# Altium footprint library IC.Pcblib: 91 footprints (part 6 of 6)
Each footprint in its own frame and in the unit in brackets; x right, y up, seen from the top. Pads: shape width x height; smd on the part's side, far side on the other; paste and mask are expansions set on the pad; w line width, h text height; cw(c..) or ccw(c..) is an arc to the next point about the centre after c.
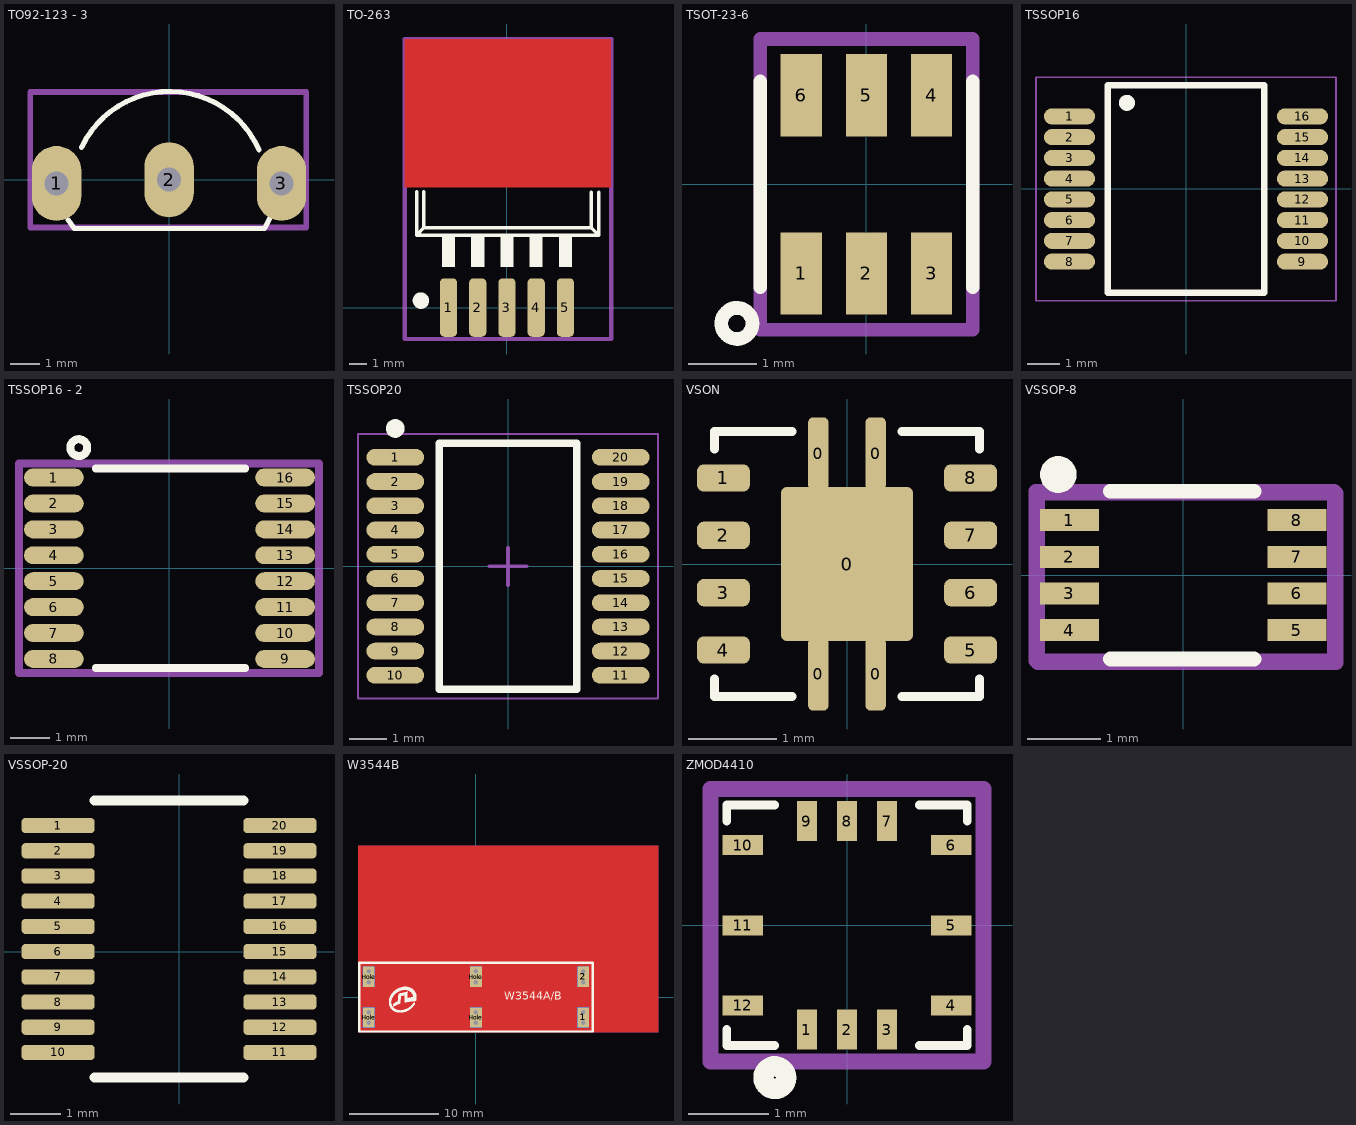
[diagram p5: the footprints below, top view; thin cyan lines are the x and y axes]

## TO92-123 - 3 [mil] "TO-92"
height 200
pads (3):
  oval 66x100 hole 32: 1(-150,-5) 2(0,0) 3(150,-5)
Top Overlay:
  lines w7: -134.46,-53.63 -126.5,-65 127.5,-65 136,-48 ; -116.52,43.21 cw(c0.97,-12.43) 119.94,39.97
Mechanical 13:
  lines w7.87: -185,-64 -185,117 183,117 183,-64 -185,-64
  text ".Designator" at -87,5.43 h39.37
Mechanical 15:
  lines w7.87: -185,-64 -185,117 183,117 183,-64 -185,-64
  text ".Comment" at -86,5.44 h39.37
3D body "User Library-TO-92_SS254.step": height 394.65, standoff -97.48, extent -159.06,-58.47 159.05,93.89

## TO-263 [mm]
pads (5):
  rrect50% 1x3.4 smd: 1(-3.4,0) 2(-1.7,0) 4(1.7,0) 5(3.4,0)
  rrect50% 1x3.4 smd mask+0: 3(0,0)
Top Layer:
  rectangle: -5.949,6.985 6.051,15.619
Top Overlay:
  circle w0.5: c-5.004,0.406 r0.23
  rectangle: 3.021,2.362 3.779,4.241
  rectangle: 1.321,2.362 2.079,4.241
  rectangle: -0.379,2.362 0.379,4.241
  rectangle: -2.079,2.362 -1.321,4.241
  rectangle: -3.779,2.362 -3.021,4.241
  lines w0.2: -5.254,6.731 -5.254,4.216 ; -4.831,6.731 -4.831,4.64 ; 4.906,6.706 4.906,4.64 ; 5.329,6.706 5.329,4.216 ; -5.254,4.216 -4.831,4.64 ; -5.254,4.216 5.329,4.216 ; -4.831,4.64 4.906,4.64 ; 4.906,4.64 5.329,4.216
Top Solder:
  rectangle: -5.517,7.366 5.609,14.529
  lines w0.254: -3.863,14.904 -5.344,14.481 ; 3.938,14.904 5.419,14.481 ; 5.588,14.351 5.715,14.224 5.715,7.239 5.08,7.239 -5.578,7.239 -5.583,7.244 -5.583,12.895 -5.583,14.165 ; 5.658,12.895 5.658,14.165 ; -5.583,14.165 cw(c-5.254,14.165) -5.345,14.481 ; -5.583,14.165 cw(c-5.254,14.165) -5.345,14.481 ; -3.773,14.917 ccw(c-3.773,14.588) -3.863,14.904 cw(c-3.773,14.588) -3.773,14.917 ; -3.773,14.917 3.847,14.917 ; 3.847,14.917 cw(c3.847,14.588) 3.938,14.904 ccw(c3.847,14.588) 3.847,14.917 ; 5.42,14.481 cw(c5.329,14.165) 5.658,14.165 ; 5.42,14.481 cw(c5.329,14.165) 5.658,14.165
  lines w0.508: -4.577,14.546 4.669,14.546
Mechanical 13:
  lines w0.254: -5.944,-1.829 6.071,-1.829 6.071,15.596 -5.944,15.596 -5.944,-1.829
  text ".Designator" at 0.584,-1.549 h3
Mechanical 15:
  lines w0.254: -5.944,-1.829 -5.944,15.621 6.071,15.621 6.071,-1.829 -5.944,-1.829
  text ".Comment" at 0.61,-1.549 h3
3D body "SW3dPS-TO-263 5Ld.STEP": height 4.57, standoff -0.01, extent -5.11,-0.87 5.05,13.77

## TSOT-23-6 [mm]
pads (6):
  rect 0.6x1.2 smd: 1(-0.95,-1.3) 2(0,-1.3) 3(0.95,-1.3) 4(0.95,1.3) 5(0,1.3) 6(-0.95,1.3)
Top Overlay:
  circle w0.2: c-1.89,-2.03 r0.227
  lines w0.2: -1.55,-1.5 -1.55,1.5 ; 1.55,-1.5 1.55,1.5
Mechanical 13:
  lines w0.2: -1.55,-2.12 -1.55,2.12 1.55,2.12 1.55,-2.12 -1.55,-2.12
  text ".Designator" at 0.32,-2.17 h1.5
Mechanical 15:
  lines w0.2: -1.55,-2.12 1.55,-2.12 1.55,2.12 -1.55,2.12 -1.55,-2.12
  text ".Comment" at 0.33,-2.21 h1.5
3D body "User Library-SOT23-6.step": height 1.3, standoff 0, extent -1.505,-1.5 1.495,1.5

## TSSOP16 [mm] "SOP, 16-Leads, Body 6.20x5.30mm, Pitch 0.65mm, IPC Medium Density"
height 2
pads (16):
  oval 1.6x0.5 smd: 1(-3.65,2.275) 2(-3.65,1.625) 3(-3.65,0.975) 4(-3.65,0.325) 5(-3.65,-0.325) 6(-3.65,-0.975) 7(-3.65,-1.625) 8(-3.65,-2.275) 9(3.65,-2.275) 10(3.65,-1.625) 11(3.65,-0.975) 12(3.65,-0.325) 13(3.65,0.325) 14(3.65,0.975) 15(3.65,1.625) 16(3.65,2.275)
Top Overlay:
  circle w0.25: c-1.85,2.7 r0.125
  lines w0.2: -2.45,-3.25 -2.45,3.25 2.45,3.25 2.45,-3.25 -2.45,-3.25
Mechanical 13:
  lines w0.05: -4.7,-3.5 4.7,-3.5 4.7,3.5 -4.7,3.5 -4.7,-3.5
  text ".Designator" at 0.483,-2.803 h2
Mechanical 15:
  lines w0.05: -4.7,-3.5 -4.7,3.5 4.7,3.5 4.7,-3.5 -4.7,-3.5
  text ".Comment" at 0.483,-3.006 h2
3D body "SOP65P780X200-16N.step": height 2, standoff 0, extent -3.9,-3.25 3.9,3.25

## TSSOP16 - 2 [mm] "SOP, 16-Leads, Body 6.20x5.30mm, Pitch 0.65mm, IPC Medium Density"
height 2
pads (16):
  oval 1.5x0.45 smd: 1(-2.9,2.275) 2(-2.9,1.625) 3(-2.9,0.975) 4(-2.9,0.325) 5(-2.9,-0.325) 6(-2.9,-0.975) 7(-2.9,-1.625) 8(-2.9,-2.275) 9(2.9,-2.275) 10(2.9,-1.625) 11(2.9,-0.975) 12(2.9,-0.325) 13(2.9,0.325) 14(2.9,0.975) 15(2.9,1.625) 16(2.9,2.275)
Top Overlay:
  circle w0.2: c-2.275,3.025 r0.212
  lines w0.2: -1.85,-2.5 1.9,-2.5 ; -1.85,2.5 1.9,2.5
Mechanical 13:
  lines w0.2: -3.775,-2.625 -3.775,2.625 3.75,2.625 3.75,-2.625 -3.775,-2.625
  text ".Designator" at 0.475,-1.775 h1.5
3D body "User Library-TSSOP-16-1.step": height 1.1, standoff 0, extent -3.2,-2.5 3.2,2.5

## TSSOP20 [mm] "TSOP, 20-Leads, Body 6.60x4.50mm, Pitch 0.65mm, IPC Medium Density"
height 1.2
pads (20):
  oval 1.55x0.45 smd: 1(-3.025,2.925) 2(-3.025,2.275) 3(-3.025,1.625) 4(-3.025,0.975) 5(-3.025,0.325) 6(-3.025,-0.325) 7(-3.025,-0.975) 8(-3.025,-1.625) 9(-3.025,-2.275) 10(-3.025,-2.925) 11(3.025,-2.925) 12(3.025,-2.275) 13(3.025,-1.625) 14(3.025,-0.975) 15(3.025,-0.325) 16(3.025,0.325) 17(3.025,0.975) 18(3.025,1.625) 19(3.025,2.275) 20(3.025,2.925)
Top Overlay:
  circle w0.25: c-3.025,3.7 r0.125
  lines w0.2: -1.85,-3.3 1.85,-3.3 1.85,3.3 -1.85,3.3 -1.85,-3.3
Mechanical 13:
  lines w0.1: -1.85,-3.3 1.85,-3.3 1.85,3.3 -1.85,3.3 -1.85,-3.3
Mechanical 15:
  lines w0.05: -4.025,-3.55 4.025,-3.55 4.025,3.55 -4.025,3.55 -4.025,-3.55
  lines w0.1: -0.5,0 0.5,0 ; 0,-0.5 0,0.5
3D body "TSOP65P650X120-20N.step": height 1.2, standoff 0, extent -3.25,-3.3 3.25,3.3

## VSON [mm]
pads (13):
  rrect50% 0.23x0.825 smd mask+0.07: 0(-0.325,-1.25) 0(-0.325,1.25) 0(0.325,-1.25) 0(0.325,1.25)
  rrect10% 1.5x1.75 smd paste-0.1 mask+0.07: 0(0,0)
  rrect50% 0.6x0.31 smd mask+0.07: 1(-1.4,0.975) 2(-1.4,0.325) 3(-1.4,-0.325) 4(-1.4,-0.975) 5(1.4,-0.975) 6(1.4,-0.325) 7(1.4,0.325) 8(1.4,0.975)
Top Overlay:
  lines w0.1: -1.5,-1.3 -1.5,-1.5 -0.625,-1.5 ; -1.5,1.3 -1.5,1.5 -0.625,1.5 ; 0.625,-1.5 1.5,-1.5 1.5,-1.3 ; 0.625,1.5 1.5,1.5 1.5,1.3
3D body: height 1, standoff 0, extent -1.5,-1.5 1.5,1.5

## VSSOP-8 [mm] "TSOP, 8-Leads, Body 3.00x4.40mm, Pitch 0.65mm, IPC Medium Density"
height 1.2
pads (8):
  rect 0.8x0.3 smd mask+0.05: 1(-1.55,0.75) 2(-1.55,0.25) 3(-1.55,-0.25) 4(-1.55,-0.75) 5(1.55,-0.75) 6(1.55,-0.25) 7(1.55,0.25) 8(1.55,0.75)
Top Overlay:
  circle w0.25: c-1.702,1.372 r0.125
  lines w0.2: -0.991,-1.143 0.965,-1.143 ; -0.991,1.143 0.965,1.143
Mechanical 13:
  lines w0.2: -2.007,-1.168 -2.007,1.143 2.057,1.143 2.057,-1.168 -2.007,-1.168
  text ".Designator" at -1.803,-0.457 h1
Mechanical 15:
  lines w0.2: -1.981,-1.194 2.083,-1.194 2.083,1.118 -1.981,1.118 -1.981,-1.194
  text ".Comment" at -1.778,-0.254 h1

## VSSOP-20 [mm]
pads (20):
  rrect50% 1.45x0.3 smd: 1(-2.4,2.5) 2(-2.4,2) 3(-2.4,1.5) 4(-2.4,1) 5(-2.4,0.5) 6(-2.4,0) 7(-2.4,-0.5) 8(-2.4,-1) 9(-2.4,-1.5) 10(-2.4,-2) 11(2,-2) 12(2,-1.5) 13(2,-1) 14(2,-0.5) 15(2,0) 16(2,0.5) 17(2,1) 18(2,1.5) 19(2,2) 20(2,2.5)
Top Overlay:
  lines w0.2: -1.675,-2.5 1.28,-2.5 ; -1.675,3 1.28,3
  text "." at -2,3 h3
3D body: height 1.1, standoff 0, extent -1.675,-2.5 1.28,3

## W3544B [mm]
pads (12):
  rect 1.3x2.25 smd far side: 1(11.95,-2.27) 2(11.95,2.27) Hole(-11.95,-2.27) Hole(-11.95,2.27) Hole(0,-2.27) Hole(0,2.27)
  rect 1.3x2.25 smd: 1(11.95,-2.27) 2(11.95,2.27) Hole(-11.95,-2.27) Hole(-11.95,2.27) Hole(0,-2.27) Hole(0,2.27)
via -11.95,-2.87 diameter 0.8 hole 0.5
via -11.95,-1.67 diameter 0.8 hole 0.5
via 0,-1.67 diameter 0.8 hole 0.5
via 0,-2.87 diameter 0.8 hole 0.5
via 11.95,-1.67 diameter 0.8 hole 0.5
via 11.95,-2.87 diameter 0.8 hole 0.5
via -11.95,2.87 diameter 0.8 hole 0.5
via -11.95,1.67 diameter 0.8 hole 0.5
via 0,2.87 diameter 0.8 hole 0.5
via 0,1.67 diameter 0.8 hole 0.5
via 11.95,2.87 diameter 0.8 hole 0.5
via 11.95,1.67 diameter 0.8 hole 0.5
Top Layer:
  pour cut-out: -13.15,-3.895 -13.15,16.855 20.3,16.855 20.3,-3.895
Bottom Layer:
  pour cut-out: -13.15,-3.895 -13.15,16.855 20.3,16.855 20.3,-3.895
Top Overlay:
  drawing of 557 lines, arcs and shapes, not listed
  text "W3544A/B" at 3.175,-0.61 h1.52
Mechanical 15:
  lines w0.1: -0.508,-0.004 0.492,-0.004 ; -0.008,-0.504 -0.008,0.496
Mechanical 16:
  lines w0.1: 13.577,-1.305 14.847,-1.305 ; 13.577,-1.305 13.577,1.286 14.847,1.286 14.847,-1.305 ; 13.577,-1.305 13.577,1.286 14.847,1.286 14.847,-1.305 ; 13.577,-1.305 14.847,-1.305
3D body: height 3, standoff 0, extent 9.913,2.571 10.511,3.17
3D body: height 3, standoff 0, extent 10.624,2.571 11.222,3.17
3D body: height 3, standoff 0, extent -13.03,-3.835 13.03,3.81
3D body: height 3, standoff 0, extent 10.624,-1.95 11.222,-1.352
3D body: height 3, standoff 0, extent 10.624,-3.169 11.222,-2.571

## ZMOD4410 [mm]
pads (12):
  rect 0.25x0.5 smd: 1(-0.5,-1.3) 2(0,-1.3) 3(0.5,-1.3) 7(0.5,1.3) 8(0,1.3) 9(-0.5,1.3)
  rect 0.5x0.25 smd: 4(1.3,-1) 5(1.3,0) 6(1.3,1) 10(-1.3,1) 11(-1.3,0) 12(-1.3,-1)
Top Overlay:
  circle w0.254: c-0.9,-1.9 r0.141
  lines w0.11: -1.5,-1.3 -1.5,-1.5 -0.9,-1.5 ; -1.5,1.3 -1.5,1.5 -0.9,1.5 ; 0.9,-1.5 1.5,-1.5 1.5,-1.3 ; 0.9,1.5 1.5,1.5 1.5,1.3
Mechanical 13:
  lines w0.2: -1.7,-1.7 1.7,-1.7 1.7,1.7 -1.7,1.7 -1.7,-1.7
  text ".Designator" at -1.7,-0.1 h1
Mechanical 15:
  lines w0.2: -1.7,-1.7 -1.7,1.7 1.7,1.7 1.7,-1.7 -1.7,-1.7
  text ".Comment" at -1.7,-0.1 h1
3D body: height 0.77, standoff 0, extent -1.5,-1.5 1.5,1.5